# Altium footprint library KEY_PLC1.PcbLib: 123 footprints (part 4 of 8)
Each footprint in its own frame and in the unit in brackets; x right, y up, seen from the top. Pads: shape width x height; smd on the part's side, far side on the other; paste and mask are expansions set on the pad; w line width, h text height; cw(c..) or ccw(c..) is an arc to the next point about the centre after c.
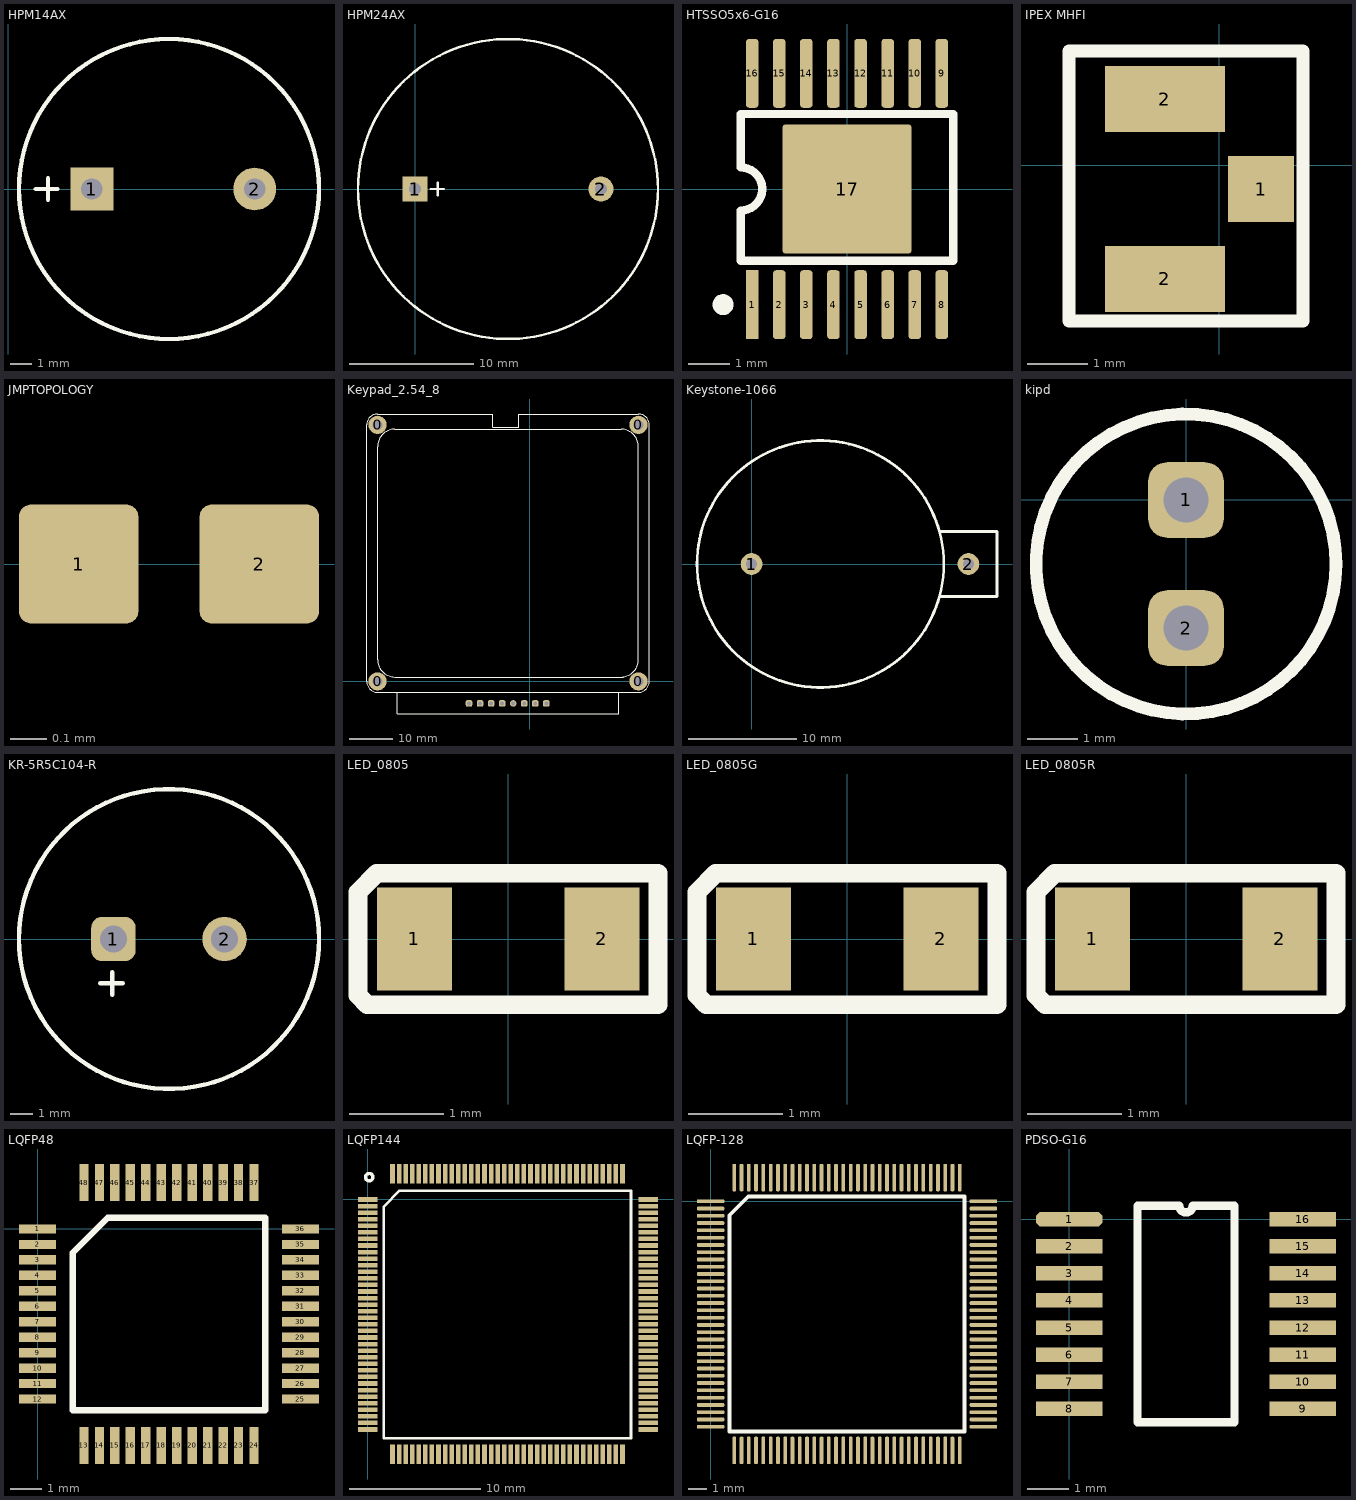
[diagram p3: the footprints below, top view; thin cyan lines are the x and y axes]

## HPM14AX [mm]
height 8
pads (2):
  rect 2x2 hole 1: 1(3.9,0)
  round 2 hole 1: 2(11.5,0)
Top Overlay:
  circle w0.2: c7.5,0 r7
  lines w0.2: 1.284,0 2.3,0 ; 1.85,-0.508 1.85,0.508

## HPM24AX [mm]
pads (2):
  rect 2x2 hole 1: 1(0,0)
  round 2 hole 1: 2(15,0)
Top Overlay:
  circle w0.2: c7.5,0 r12.1
  lines w0.2: 1.284,0 2.3,0 ; 1.85,-0.508 1.85,0.508

## HTSSO5x6-G16 [mm] "Shrink Small Outline; 16 Leads; Body Width 4.4 mm; Pitch 0.65 mm"
height 1.1
pads (17):
  rect 0.3x1.65 smd: 1(-2.275,-2.775)
  rrect50% 0.3x1.65 smd: 2(-1.625,-2.775) 3(-0.975,-2.775) 4(-0.325,-2.775) 5(0.325,-2.775) 6(0.975,-2.775) 7(1.625,-2.775) 8(2.275,-2.775) 9(2.275,2.775) 10(1.625,2.775) 11(0.975,2.775) 12(0.325,2.775) 13(-0.325,2.775) 14(-0.975,2.775) 15(-1.625,2.775) 16(-2.275,2.775)
  rrect5% 3.1x3.1 smd: 17(0,0)
Top Overlay:
  circle w0.25: c-2.975,-2.775 r0.125
  lines w0.2: -2.55,-1.725 -2.55,-0.517 ccw(c-2.55,0) -2.55,0.517 -2.55,1.8 2.55,1.8 2.55,-1.725 -2.55,-1.725
3D body "User Library-TSSOP-16.step": height 1, standoff 0, extent -2.5,-3.175 2.5,3.225

## IPEX MHFI [mm] "SOT23, 3-Leads, Body 2.9x1.3mm, Pitch 0.95mm, Lead Span 2.3mm - Reverse Pinning, IPC Medium Density"
height 1.1
pads (3):
  rect 1.1x1.1 smd: 1(0.7,-0.4)
  rect 2x1.1 smd: 2(-0.9,-1.9) 2(-0.9,1.1)
Top Overlay:
  lines w0.22: -2.5,-2.6 -2.5,1.9 1.4,1.9 1.4,-2.6 -2.5,-2.6
3D body "User Library-20279-001.step": height 1.25, standoff -0.01, extent -2.45,-1.9 0.65,1.1

## JMPTOPOLOGY [mm] "JMP"
height 0.5
pads (2):
  rrect20% 0.33x0.33 smd: 1(-1,0) 2(-0.5,0)

## Keypad_2.54_8 [mm]
pads (12):
  round 4.2 hole 2.3: 0(-35,0) 0(-35,59) 0(25,0) 0(25,59)
  rrect50% 1.5x1.5 hole 0.9: 1(-13.97,-5.08) 2(-11.43,-5.08) 3(-8.89,-5.08) 4(-6.35,-5.08) 6(-1.27,-5.08) 7(1.27,-5.08) 8(3.81,-5.08)
  round 1.5 hole 0.9: 5(-3.81,-5.08)
Top Overlay:
  lines w0.254: -30.5,-2.5 -30.5,-7.5 -17,-7.5 20.5,-7.5 20.5,-2.5 ; 21,1 ccw(c21,5) 25,5 25,54 ccw(c21,54) 21,58 -31,58 ccw(c-31,54) -35,54 -35,5 ccw(c-31,5) -31,1 21.5,1 ; -37.5,0 ccw(c-35,0) -35,-2.5 25,-2.5 ccw(c25,0) 27.5,0 27.5,59 ccw(c25,59) 25,61.5 -2.5,61.5 -2.5,58.5 -8.5,58.5 -8.5,61.5 -35,61.5 ccw(c-35,59) -37.5,59 -37.5,0

## Keystone-1066 [mm] "Bat holder"
height 10
pads (2):
  round 2 hole 1: 1(0,0) 2(20,0)
Top Overlay:
  circle w0.254: c6.35,0 r11.38
  lines w0.254: 17.323,-3 22.632,-3 22.632,3 17.323,3
3D body "User Library-20mm_coin_holder.step": height 8.67, standoff -3.5, extent -4.8,-11.5 22.631,11.5

## kipd [mm]
pads (2):
  rrect50% 1.5x1.5 hole 0.9: 1(0,0) 2(0,-2.54)
Top Overlay:
  circle w0.254: c0,-1.27 r2.976

## KR-5R5C104-R [mm] "ionister 0.1 F"
height 5
pads (2):
  rrect50% 2x2 hole 1.2: 1(5,0)
  round 2 hole 1.2: 2(10,0)
Top Overlay:
  circle w0.2: c7.5,0 r6.75
  lines w0.2: 4.4,-2 5.416,-2 ; 4.95,-2.508 4.95,-1.492
3D body "CAP1.step": height 0, standoff -8, extent 0.763,-6.75 14.237,6.697

## LED_0805 [mm]
height 2
pads (2):
  rect 0.8x1.1 smd: 1(-1,0) 2(1,0)
Top Overlay:
  lines w0.2: -1.6,-0.6 -1.6,-0.117 -1.6,0.5 -1.4,0.7 1.6,0.7 1.6,-0.7 -1.5,-0.7 -1.6,-0.6
3D body "User Library-User Library-led_0805 YEL.step": height 1.1, standoff 0, extent -1.01,-0.625 1.01,0.625

## LED_0805G [mm]
height 2
pads (2):
  rect 0.8x1.1 smd: 1(-1,0) 2(1,0)
Top Overlay:
  lines w0.2: -1.6,-0.6 -1.5,-0.7 1.6,-0.7 1.6,0.7 -1.4,0.7 -1.6,0.5 -1.6,-0.117 -1.6,-0.6
3D body "User Library-User Library-led_0805 GRE.step": height 1.1, standoff 0, extent -1.01,-0.625 1.01,0.625

## LED_0805R [mm] "RED LED 0805"
height 2
pads (2):
  rect 0.8x1.1 smd: 1(-1,0) 2(1,0)
Top Overlay:
  lines w0.2: -1.6,-0.6 -1.6,-0.117 -1.6,0.5 -1.4,0.7 1.6,0.7 1.6,-0.7 -1.5,-0.7 -1.6,-0.6
3D body "User Library-led_0805.step": height 1.1, standoff 0, extent -1.01,-0.625 1.01,0.625

## LQFP48 [mm]
pads (48):
  rect 1.2x0.3 smd: 1(0,0) 2(0,-0.5) 3(0,-1) 4(0,-1.5) 5(0,-2) 6(0,-2.5) 7(0,-3) 8(0,-3.5) 9(0,-4) 10(0,-4.5) 11(0,-5) 12(0,-5.5) 25(8.5,-5.5) 26(8.5,-5) 27(8.5,-4.5) 28(8.5,-4) 29(8.5,-3.5) 30(8.5,-3) 31(8.5,-2.5) 32(8.5,-2) 33(8.5,-1.5) 34(8.5,-1) 35(8.5,-0.5) 36(8.5,0)
  rect 0.3x1.2 smd: 13(1.5,-7) 14(2,-7) 15(2.5,-7) 16(3,-7) 17(3.5,-7) 18(4,-7) 19(4.5,-7) 20(5,-7) 21(5.5,-7) 22(6,-7) 23(6.5,-7) 24(7,-7) 37(7,1.5) 38(6.5,1.5) 39(6,1.5) 40(5.5,1.5) 41(5,1.5) 42(4.5,1.5) 43(4,1.5) 44(3.5,1.5) 45(3,1.5) 46(2.5,1.5) 47(2,1.5) 48(1.5,1.5)
Top Overlay:
  lines w0.2: 1.135,-5.865 1.135,-0.77 2.27,0.365 7.365,0.365 7.365,-5.865 1.135,-5.865
3D body "User Library-LQFP48-2.STEP": height 1.62, standoff -0.01, extent -0.3,-7.343 8.843,1.8

## LQFP144 [mm]
pads (144):
  rect 1.5x0.35 smd: 1(0,0) 2(0,-0.5) 3(0,-1) 4(0,-1.5) 5(0,-2) 6(0,-2.5) 7(0,-3) 8(0,-3.5) 9(0,-4) 10(0,-4.5) 11(0,-5) 12(0,-5.5) 13(0,-6) 14(0,-6.5) 15(0,-7) 16(0,-7.5) 17(0,-8) 18(0,-8.5) 19(0,-9) 20(0,-9.5) 21(0,-10) 22(0,-10.5) 23(0,-11) 24(0,-11.5) 25(0,-12) 26(0,-12.5) 27(0,-13) 28(0,-13.5) 29(0,-14) 30(0,-14.5) 31(0,-15) 32(0,-15.5) 33(0,-16) 34(0,-16.5) 35(0,-17) 36(0,-17.5) 73(21.325,-17.5) 74(21.325,-17) 75(21.325,-16.5) 76(21.325,-16) 77(21.325,-15.5) 78(21.325,-15) 79(21.325,-14.5) 80(21.325,-14) 81(21.325,-13.5) 82(21.325,-13) 83(21.325,-12.5) 84(21.325,-12) 85(21.325,-11.5) 86(21.325,-11) 87(21.325,-10.5) 88(21.325,-10) 89(21.325,-9.5) 90(21.325,-9) 91(21.325,-8.5) 92(21.325,-8) 93(21.325,-7.5) 94(21.325,-7) 95(21.325,-6.5) 96(21.325,-6) 97(21.325,-5.5) 98(21.325,-5) 99(21.325,-4.5) 100(21.325,-4) 101(21.325,-3.5) 102(21.325,-3) 103(21.325,-2.5) 104(21.325,-2) 105(21.325,-1.5) 106(21.325,-1) 107(21.325,-0.5) 108(21.325,0)
  rect 0.35x1.5 smd: 37(1.875,-19.375) 38(2.375,-19.375) 39(2.875,-19.375) 40(3.375,-19.375) 41(3.875,-19.375) 42(4.375,-19.375) 43(4.875,-19.375) 44(5.375,-19.375) 45(5.875,-19.375) 46(6.375,-19.375) 47(6.875,-19.375) 48(7.375,-19.375) 49(7.875,-19.375) 50(8.375,-19.375) 51(8.875,-19.375) 52(9.375,-19.375) 53(9.875,-19.375) 54(10.375,-19.375) 55(10.875,-19.375) 56(11.375,-19.375) 57(11.875,-19.375) 58(12.375,-19.375) 59(12.875,-19.375) 60(13.375,-19.375) 61(13.875,-19.375) 62(14.375,-19.375) 63(14.875,-19.375) 64(15.375,-19.375) 65(15.875,-19.375) 66(16.375,-19.375) 67(16.875,-19.375) 68(17.375,-19.375) 69(17.875,-19.375) 70(18.375,-19.375) 71(18.875,-19.375) 72(19.375,-19.375) 109(19.375,1.95) 110(18.875,1.95) 111(18.375,1.95) 112(17.875,1.95) 113(17.375,1.95) 114(16.875,1.95) 115(16.375,1.95) 116(15.875,1.95) 117(15.375,1.95) 118(14.875,1.95) 119(14.375,1.95) 120(13.875,1.95) 121(13.375,1.95) 122(12.875,1.95) 123(12.375,1.95) 124(11.875,1.95) 125(11.375,1.95) 126(10.875,1.95) 127(10.375,1.95) 128(9.875,1.95) 129(9.375,1.95) 130(8.875,1.95) 131(8.375,1.95) 132(7.875,1.95) 133(7.375,1.95) 134(6.875,1.95) 135(6.375,1.95) 136(5.875,1.95) 137(5.375,1.95) 138(4.875,1.95) 139(4.375,1.95) 140(3.875,1.95) 141(3.375,1.95) 142(2.875,1.95) 143(2.375,1.95) 144(1.875,1.95)
Top Overlay:
  circle w0.254: c0.1,1.7 r0.283
  lines w0.2: 1.21,-18.165 1.21,-0.545 2.42,0.665 20.025,0.665 20.025,-18.165 1.21,-18.165
3D body "User Library-LQFP144-1.step": height 1.63, standoff 0.03, extent -0.375,-19.75 21.625,2.25

## LQFP-128 [mm]
pads (128):
  rrect50% 1.5x0.204 smd: 1(0,0) 2(0,-0.4) 3(0,-0.8) 4(0,-1.2) 5(0,-1.6) 6(0,-2) 7(0,-2.4) 8(0,-2.8) 9(0,-3.2) 10(0,-3.6) 11(0,-4) 12(0,-4.4) 13(0,-4.8) 14(0,-5.2) 15(0,-5.6) 16(0,-6) 17(0,-6.4) 18(0,-6.8) 19(0,-7.2) 20(0,-7.6) 21(0,-8) 22(0,-8.4) 23(0,-8.8) 24(0,-9.2) 25(0,-9.6) 26(0,-10) 27(0,-10.4) 28(0,-10.8) 29(0,-11.2) 30(0,-11.6) 31(0,-12) 32(0,-12.4) 65(15,-12.4) 66(15,-12) 67(15,-11.6) 68(15,-11.2) 69(15,-10.8) 70(15,-10.4) 71(15,-10) 72(15,-9.6) 73(15,-9.2) 74(15,-8.8) 75(15,-8.4) 76(15,-8) 77(15,-7.6) 78(15,-7.2) 79(15,-6.8) 80(15,-6.4) 81(15,-6) 82(15,-5.6) 83(15,-5.2) 84(15,-4.8) 85(15,-4.4) 86(15,-4) 87(15,-3.6) 88(15,-3.2) 89(15,-2.8) 90(15,-2.4) 91(15,-2) 92(15,-1.6) 93(15,-1.2) 94(15,-0.8) 95(15,-0.4) 96(15,0)
  rrect50% 0.204x1.5 smd: 33(1.3,-13.7) 34(1.7,-13.7) 35(2.1,-13.7) 36(2.5,-13.7) 37(2.9,-13.7) 38(3.3,-13.7) 39(3.7,-13.7) 40(4.1,-13.7) 41(4.5,-13.7) 42(4.9,-13.7) 43(5.3,-13.7) 44(5.7,-13.7) 45(6.1,-13.7) 46(6.5,-13.7) 47(6.9,-13.7) 48(7.3,-13.7) 49(7.7,-13.7) 50(8.1,-13.7) 51(8.5,-13.7) 52(8.9,-13.7) 53(9.3,-13.7) 54(9.7,-13.7) 55(10.1,-13.7) 56(10.5,-13.7) 57(10.9,-13.7) 58(11.3,-13.7) 59(11.7,-13.7) 60(12.1,-13.7) 61(12.5,-13.7) 62(12.9,-13.7) 63(13.3,-13.7) 64(13.7,-13.7) 97(13.7,1.3) 98(13.3,1.3) 99(12.9,1.3) 100(12.5,1.3) 101(12.1,1.3) 102(11.7,1.3) 103(11.3,1.3) 104(10.9,1.3) 105(10.5,1.3) 106(10.1,1.3) 107(9.7,1.3) 108(9.3,1.3) 109(8.9,1.3) 110(8.5,1.3) 111(8.1,1.3) 112(7.7,1.3) 113(7.3,1.3) 114(6.9,1.3) 115(6.5,1.3) 116(6.1,1.3) 117(5.7,1.3) 118(5.3,1.3) 119(4.9,1.3) 120(4.5,1.3) 121(4.1,1.3) 122(3.7,1.3) 123(3.3,1.3) 124(2.9,1.3) 125(2.5,1.3) 126(2.1,1.3) 127(1.7,1.3) 128(1.3,1.3)
Top Overlay:
  lines w0.2: 1.035,-12.665 1.035,-0.77 2.07,0.265 13.965,0.265 13.965,-12.665 1.035,-12.665

## PDSO-G16 [mm]
pads (16):
  oct 1.6x0.35 smd: 1(0,0)
  rect 1.6x0.35 smd: 2(0,-0.65) 3(0,-1.3) 4(0,-1.95) 5(0,-2.6) 6(0,-3.25) 7(0,-3.9) 8(0,-4.55) 9(5.6,-4.55) 10(5.6,-3.9) 11(5.6,-3.25) 12(5.6,-2.6) 13(5.6,-1.95) 14(5.6,-1.3) 15(5.6,-0.65) 16(5.6,0)
Top Overlay:
  lines w0.2: 1.635,-4.875 1.635,0.325 2.638,0.325 ccw(c2.8,0.325) 2.962,0.325 3.965,0.325 3.965,-4.875 1.635,-4.875
3D body "User Library-SOIC16_Wide_JEDEC_MS-013AA.step": height 1.22, standoff -1.43, extent -2.75,-7.515 7.75,3.115